# Altium footprint library JEDEC_G.PcbLib: 194 footprints (part 4 of 13)
Each footprint in its own frame and in the unit in brackets; x right, y up, seen from the top. Pads: shape width x height; smd on the part's side, far side on the other; paste and mask are expansions set on the pad; w line width, h text height; cw(c..) or ccw(c..) is an arc to the next point about the centre after c.
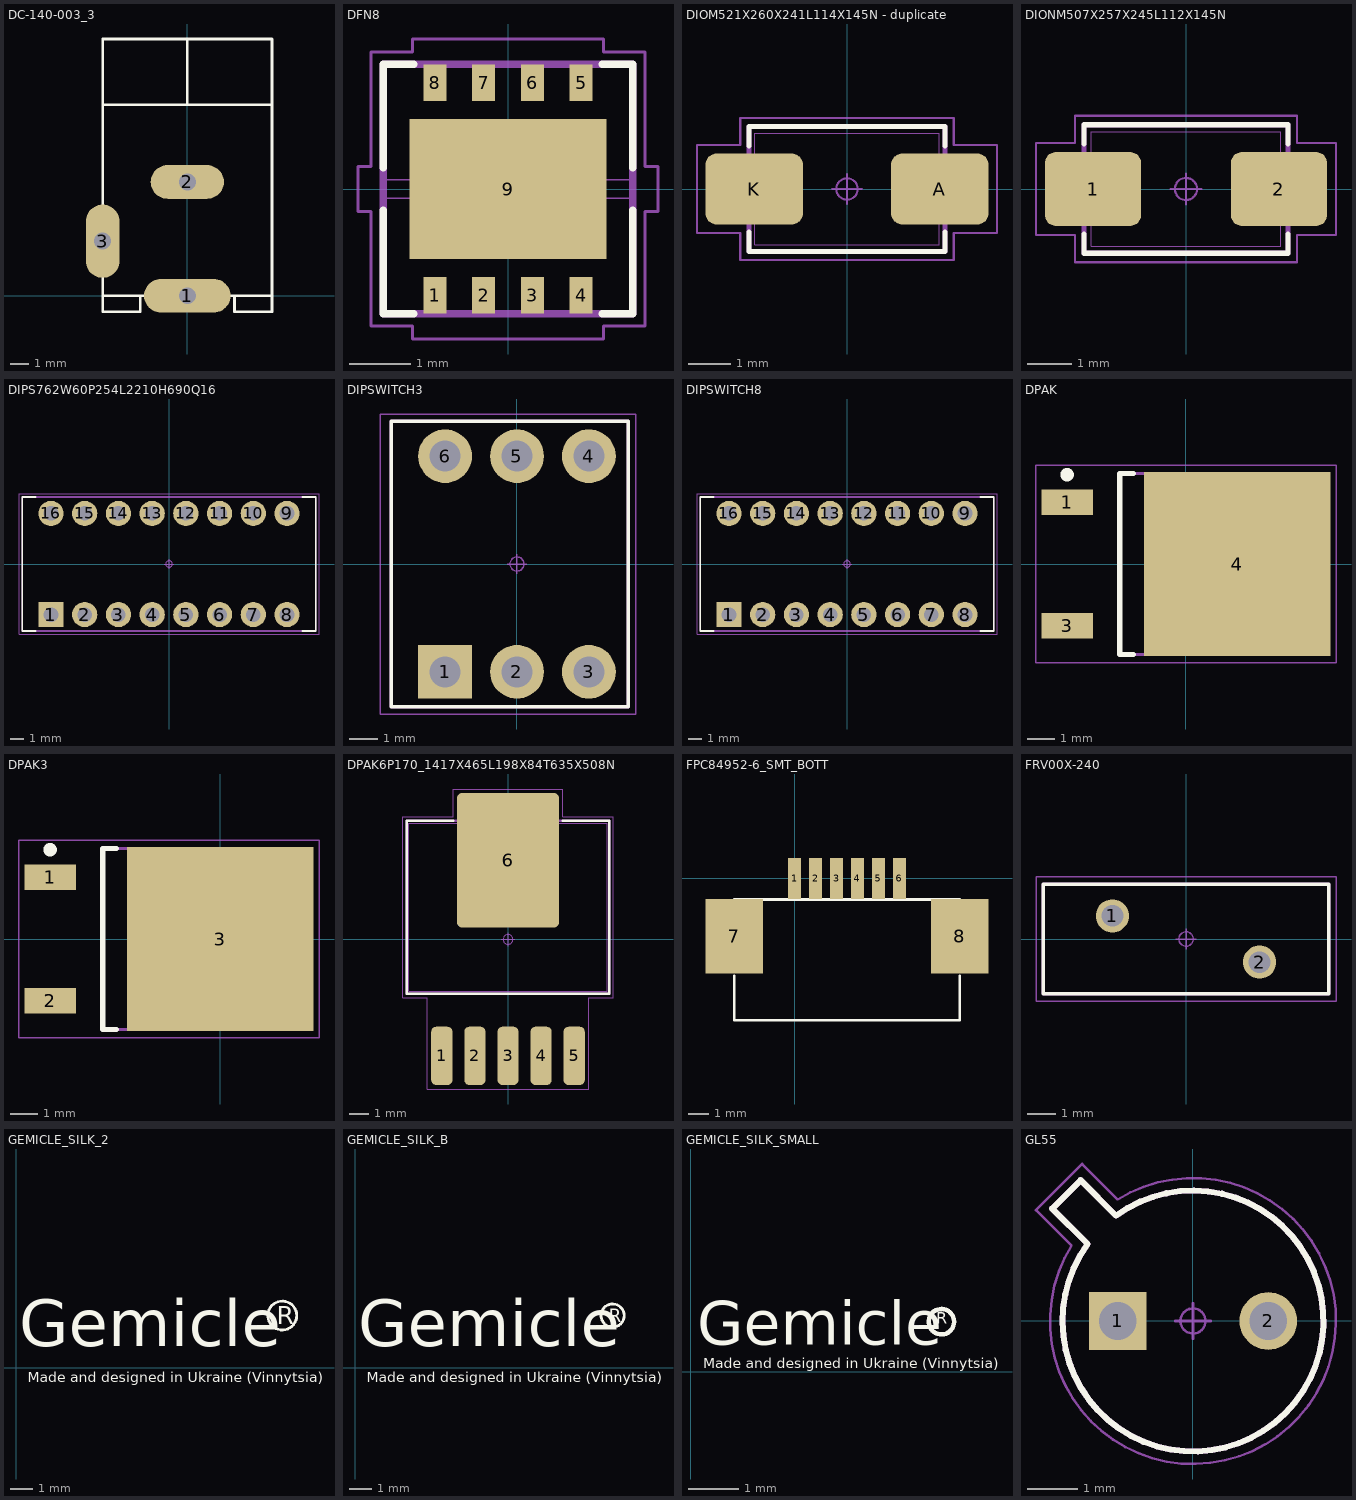
[diagram p3: the footprints below, top view; thin cyan lines are the x and y axes]

## DC-140-003_3 [mm]
pads (3):
  oval 4.6x1.8 hole 0.9: 1(0,0)
  oval 3.9x1.8 hole 0.9: 2(0,6.05)
  oval 1.8x3.9 hole 0.9: 3(-4.5,2.9)
Top Overlay:
  lines w0.15: -4.5,10.15 4.475,10.15 ; -2.5,0 -2.5,-0.85 -4.5,-0.85 -4.5,0 ; 0,10.15 0,13.65 ; 2.5,0 2.5,-0.85 4.5,-0.85 4.5,0 ; -4.5,0 4.5,0 ; -4.5,0 -4.5,13.65 4.5,13.65 4.5,0
Mechanical 16:
  lines w0.05: -4.95,1.85 ccw(c-4.5,1.85) -4.05,1.85 -4.05,3.95 ccw(c-4.5,3.95) -4.95,3.95 -4.95,1.85 ; -1.3,-0.45 cw(c-1.3,0) -1.3,0.45 1.3,0.45 cw(c1.3,0) 1.3,-0.45 -1.3,-0.45 ; -1.05,5.6 cw(c-1.05,6.05) -1.05,6.5 1.05,6.5 cw(c1.05,6.05) 1.05,5.6 -1.05,5.6
3D body "CUI_PJ-102A.STEP": height 11, standoff -3.5, extent -5,-0.8 4.4,13.6

## DFN8 [mm] "Quad Flat No-Lead (QFN), 0.80 mm pitch; square, 4 pin X 1 pin, 4.00 mm L X 4.00 mm W X 1.00 mm H body"
height 1
pads (9):
  rect 0.38x0.6 smd: 1(-1.2,-1.75) 2(-0.4,-1.75) 3(0.4,-1.75) 4(1.2,-1.75) 5(1.2,1.75) 6(0.4,1.75) 7(-0.4,1.75) 8(-1.2,1.75)
  rect 3.24x2.3 smd: 9(0,0)
Top Overlay:
  lines w0.12: -2.05,-0.35 -2.05,-2.05 -1.55,-2.05 ; -2.05,0.35 -2.05,2.05 -1.55,2.05 ; 1.55,-2.05 2.05,-2.05 2.05,-0.35 ; 1.55,2.05 2.05,2.05 2.05,0.35
Mechanical 11:
  lines w0.12: -2.05,-2.05 2.05,-2.05 2.05,2.05 -2.05,2.05 -2.05,-2.05
Mechanical 12:
  lines w0.025: -2,-2 2,-2 2,2 -2,2 -2,-2 ; -2,-0.152 -2,0.152 -1.5,0.152 -1.5,-0.152 -2,-0.152 ; -1.352,-2 -1.352,-1.5 -1.048,-1.5 -1.048,-2 -1.352,-2 ; -1.352,1.5 -1.352,2 -1.048,2 -1.048,1.5 -1.352,1.5 ; -0.553,-2 -0.553,-1.5 -0.248,-1.5 -0.248,-2 -0.553,-2 ; -0.553,1.5 -0.553,2 -0.248,2 -0.248,1.5 -0.553,1.5 ; 0.248,-2 0.248,-1.5 0.553,-1.5 0.553,-2 0.248,-2 ; 0.248,1.5 0.248,2 0.553,2 0.553,1.5 0.248,1.5 ; 1.048,-2 1.048,-1.5 1.352,-1.5 1.352,-2 1.048,-2 ; 1.048,1.5 1.048,2 1.352,2 1.352,1.5 1.048,1.5 ; 1.5,-0.152 2,-0.152 2,0.152 1.5,0.152 1.5,-0.152
Mechanical 15:
  circle w0.05: c0,0 r0.25
  lines w0.05: -0.35,0 0.35,0 ; 0,-0.35 0,0.35 ; -2.465,-0.37 -2.25,-0.37 -2.25,-2.25 -1.57,-2.25 -1.57,-2.465 1.57,-2.465 1.57,-2.25 2.25,-2.25 2.25,-0.37 2.465,-0.37 2.465,0.37 2.25,0.37 2.25,2.25 1.57,2.25 1.57,2.465 -1.57,2.465 -1.57,2.25 -2.25,2.25 -2.25,0.37 -2.465,0.37 -2.465,-0.37
Mechanical 16:
  text ".Designator" at 0,0 h1.2
3D body "DFN8.STEP": height 1, standoff 0, extent -2.05,-2.05 2.05,2.05

## DIOM521X260X241L114X145N - duplicate [mm] "Diode, Molded Body; 4.315 mm L X 2.605 mm W X 2.41 mm H body"
height 2.41
pads (2):
  rrect30% 2.27x1.65 smd: A(2.165,0) K(-2.165,0)
Top Overlay:
  lines w0.12: -2.29,-1.005 -2.29,-1.46 2.29,-1.46 2.29,-1.005 ; -2.29,1.005 -2.29,1.46 2.29,1.46 2.29,1.005
Mechanical 11:
  lines w0.12: -2.29,-1.46 -2.29,1.46 2.29,1.46 2.29,-1.46 -2.29,-1.46
Mechanical 12:
  lines w0.025: -2.605,-0.725 -1.465,-0.725 -1.465,0.725 -2.605,0.725 -2.605,-0.725 ; -2.157,-1.302 -2.157,1.302 2.157,1.302 2.157,-1.302 -2.157,-1.302 ; 1.465,-0.725 1.465,0.725 2.605,0.725 2.605,-0.725 1.465,-0.725
Mechanical 15:
  circle w0.05: c0,0 r0.25
  lines w0.05: -0.35,0 0.35,0 ; 0,-0.35 0,0.35 ; -3.5,-1.025 -3.5,1.025 -2.49,1.025 -2.49,1.66 2.49,1.66 2.49,1.025 3.5,1.025 3.5,-1.025 2.49,-1.025 2.49,-1.66 -2.49,-1.66 -2.49,-1.025 -3.5,-1.025
3D body "DIOM521X260X241L114X145.STEP": height 2.41, standoff 0, extent -2.605,-1.302 2.605,1.302

## DIONM507X257X245L112X145N [mm] "Diode, Non-Polarized, Molded Body; 4.275 mm L X 2.575 mm W X 2.45 mm H body"
height 2.45
pads (2):
  rrect30% 2.17x1.67 smd: 1(-2.095,0) 2(2.095,0)
Top Overlay:
  lines w0.12: -2.3,-1.015 -2.3,-1.45 2.3,-1.45 2.3,-1.015 ; -2.3,1.015 -2.3,1.45 2.3,1.45 2.3,1.015
Mechanical 11:
  lines w0.12: -2.3,-1.45 2.3,-1.45 2.3,1.45 -2.3,1.45 -2.3,-1.45
Mechanical 12:
  lines w0.025: -2.538,-0.725 -2.538,0.725 -1.412,0.725 -1.412,-0.725 -2.538,-0.725 ; -2.137,-1.288 2.137,-1.288 2.137,1.288 -2.137,1.288 -2.137,-1.288 ; 1.412,-0.725 2.538,-0.725 2.538,0.725 1.412,0.725 1.412,-0.725
Mechanical 15:
  circle w0.05: c0,0 r0.25
  lines w0.05: -0.35,0 0.35,0 ; 0,-0.35 0,0.35 ; -3.38,-1.035 -2.5,-1.035 -2.5,-1.65 2.5,-1.65 2.5,-1.035 3.38,-1.035 3.38,1.035 2.5,1.035 2.5,1.65 -2.5,1.65 -2.5,1.035 -3.38,1.035 -3.38,-1.035
3D body "DIONM507X257X245L112X145.STEP": height 2.45, standoff 0, extent -2.538,-1.288 2.538,1.288

## DIPS762W60P254L2210H690Q16 [mm] "DIPS, 7.62 mm lead span, 2.54 mm pitch; 16 pin, 22.10 mm L X 10.10 mm W X 6.90 mm H body"
height 6.9
pads (16):
  rect 1.9x1.9 / inner round 1.71 / far side rect 1.71x1.71 hole 1.1 paste-1.71: 1(-8.89,-3.81)
  round 1.9 / inner round 1.71 / far side round 1.71 hole 1.1 paste-1.71: 2(-6.35,-3.81) 3(-3.81,-3.81) 4(-1.27,-3.81) 5(1.27,-3.81) 6(3.81,-3.81) 7(6.35,-3.81) 8(8.89,-3.81) 9(8.89,3.81) 10(6.35,3.81) 11(3.81,3.81) 12(1.27,3.81) 13(-1.27,3.81) 14(-3.81,3.81) 15(-6.35,3.81) 16(-8.89,3.81)
Top Overlay:
  lines w0.12: -10.03,-5.05 -11.05,-5.05 -11.05,5.05 -10.03,5.05 ; 10.03,-5.05 11.05,-5.05 11.05,5.05 10.03,5.05
Mechanical 11:
  lines w0.12: -11.05,-5.05 11.05,-5.05 11.05,5.05 -11.05,5.05 -11.05,-5.05
Mechanical 12:
  lines w0.025: -11.05,-5.05 11.05,-5.05 11.05,5.05 -11.05,5.05 -11.05,-5.05 ; -9.24,-4.16 -9.24,-3.46 -8.54,-3.46 -8.54,-4.16 -9.24,-4.16 ; -9.24,3.46 -9.24,4.16 -8.54,4.16 -8.54,3.46 -9.24,3.46 ; -6.7,-4.16 -6.7,-3.46 -6,-3.46 -6,-4.16 -6.7,-4.16 ; -6.7,3.46 -6.7,4.16 -6,4.16 -6,3.46 -6.7,3.46 ; -4.16,-4.16 -4.16,-3.46 -3.46,-3.46 -3.46,-4.16 -4.16,-4.16 ; -4.16,3.46 -4.16,4.16 -3.46,4.16 -3.46,3.46 -4.16,3.46 ; -1.62,-4.16 -1.62,-3.46 -0.92,-3.46 -0.92,-4.16 -1.62,-4.16 ; -1.62,3.46 -1.62,4.16 -0.92,4.16 -0.92,3.46 -1.62,3.46 ; 0.92,-4.16 0.92,-3.46 1.62,-3.46 1.62,-4.16 0.92,-4.16 ; 0.92,3.46 0.92,4.16 1.62,4.16 1.62,3.46 0.92,3.46 ; 3.46,-4.16 3.46,-3.46 4.16,-3.46 4.16,-4.16 3.46,-4.16 ; 3.46,3.46 3.46,4.16 4.16,4.16 4.16,3.46 3.46,3.46 ; 6,-4.16 6,-3.46 6.7,-3.46 6.7,-4.16 6,-4.16 ; 6,3.46 6,4.16 6.7,4.16 6.7,3.46 6,3.46 ; 8.54,-4.16 8.54,-3.46 9.24,-3.46 9.24,-4.16 8.54,-4.16 ; 8.54,3.46 8.54,4.16 9.24,4.16 9.24,3.46 8.54,3.46
Mechanical 15:
  circle w0.05: c0,0 r0.25
  lines w0.05: -0.35,0 0.35,0 ; 0,-0.35 0,0.35 ; -11.3,-5.3 11.3,-5.3 11.3,5.3 -11.3,5.3 -11.3,-5.3
Mechanical 16:
  text ".Designator" at 0,0 h1.2
3D body "DIPS762W60P254L2210H690Q16.STEP": height 6.9, standoff -2, extent -11.05,-5.05 11.05,5.05

## DIPSWITCH3 [mm]
height 6.9
pads (6):
  rect 1.9x1.9 / inner round 1.71 / far side round 1.71 hole 1.1 paste-1.71: 1(-2.54,-3.81)
  round 1.9 / inner round 1.71 / far side round 1.71 hole 1.1 paste-1.71: 2(0,-3.81) 3(2.54,-3.81) 4(2.54,3.81) 5(0,3.81) 6(-2.54,3.81)
Top Overlay:
  lines w0.12: -4.445,-5.05 -4.445,5.05 3.937,5.05 3.937,-5.05 -4.445,-5.05
Mechanical 11:
  lines w0.12: -4.445,-5.05 3.937,-5.05 3.937,5.05 -4.445,5.05 -4.445,-5.05
Mechanical 15:
  circle w0.05: c0,0 r0.25
  lines w0.05: -0.35,0 0.35,0 ; 0,-0.35 0,0.35 ; -4.826,-5.3 4.191,-5.3 4.191,5.3 -4.826,5.3 -4.826,-5.3
Mechanical 16:
  text ".Designator" at 0,0 h1.2
3D body "DIP Switch x03 Red.stp": height 6.85, standoff -3.4, extent -4.31,-4.95 4.31,4.95

## DIPSWITCH8 [mm] "DIPS, 7.62 mm lead span, 2.54 mm pitch; 16 pin, 22.10 mm L X 10.10 mm W X 6.90 mm H body"
height 6.9
pads (16):
  rect 1.9x1.9 / inner round 1.71 / far side rect 1.71x1.71 hole 1.1 paste-1.71: 1(-8.89,-3.81)
  round 1.9 / inner round 1.71 / far side round 1.71 hole 1.1 paste-1.71: 2(-6.35,-3.81) 3(-3.81,-3.81) 4(-1.27,-3.81) 5(1.27,-3.81) 6(3.81,-3.81) 7(6.35,-3.81) 8(8.89,-3.81) 9(8.89,3.81) 10(6.35,3.81) 11(3.81,3.81) 12(1.27,3.81) 13(-1.27,3.81) 14(-3.81,3.81) 15(-6.35,3.81) 16(-8.89,3.81)
Top Overlay:
  lines w0.12: -10.03,-5.05 -11.05,-5.05 -11.05,5.05 -10.03,5.05 ; 10.03,-5.05 11.05,-5.05 11.05,5.05 10.03,5.05
Mechanical 11:
  lines w0.12: -11.05,-5.05 -11.05,5.05 11.05,5.05 11.05,-5.05 -11.05,-5.05
Mechanical 12:
  lines w0.025: -11.05,-5.05 -11.05,5.05 11.05,5.05 11.05,-5.05 -11.05,-5.05 ; -9.24,-4.16 -8.54,-4.16 -8.54,-3.46 -9.24,-3.46 -9.24,-4.16 ; -9.24,3.46 -8.54,3.46 -8.54,4.16 -9.24,4.16 -9.24,3.46 ; -6.7,-4.16 -6,-4.16 -6,-3.46 -6.7,-3.46 -6.7,-4.16 ; -6.7,3.46 -6,3.46 -6,4.16 -6.7,4.16 -6.7,3.46 ; -4.16,-4.16 -3.46,-4.16 -3.46,-3.46 -4.16,-3.46 -4.16,-4.16 ; -4.16,3.46 -3.46,3.46 -3.46,4.16 -4.16,4.16 -4.16,3.46 ; -1.62,-4.16 -0.92,-4.16 -0.92,-3.46 -1.62,-3.46 -1.62,-4.16 ; -1.62,3.46 -0.92,3.46 -0.92,4.16 -1.62,4.16 -1.62,3.46 ; 0.92,-4.16 1.62,-4.16 1.62,-3.46 0.92,-3.46 0.92,-4.16 ; 0.92,3.46 1.62,3.46 1.62,4.16 0.92,4.16 0.92,3.46 ; 3.46,-4.16 4.16,-4.16 4.16,-3.46 3.46,-3.46 3.46,-4.16 ; 3.46,3.46 4.16,3.46 4.16,4.16 3.46,4.16 3.46,3.46 ; 6,-4.16 6.7,-4.16 6.7,-3.46 6,-3.46 6,-4.16 ; 6,3.46 6.7,3.46 6.7,4.16 6,4.16 6,3.46 ; 8.54,-4.16 9.24,-4.16 9.24,-3.46 8.54,-3.46 8.54,-4.16 ; 8.54,3.46 9.24,3.46 9.24,4.16 8.54,4.16 8.54,3.46
Mechanical 15:
  circle w0.05: c0,0 r0.25
  lines w0.05: -0.35,0 0.35,0 ; 0,-0.35 0,0.35 ; -11.3,-5.3 -11.3,5.3 11.3,5.3 11.3,-5.3 -11.3,-5.3
Mechanical 16:
  text ".Designator" at 0,0 h1.2
3D body "Grayhill_78B08T.stp": height 8.02, standoff -3.43, extent -11.2,-4.95 11.2,4.95

## DPAK [mm] "D-PAK, 3-Pads, Body 6,20x6,72mm (max), IPC Medium Density"
height 2.38
pads (3):
  rect 1.9x0.95 smd: 1(-4.4,2.28) 3(-4.4,-2.28)
  rect 6.9x6.8 smd: 4(1.9,0)
Top Overlay:
  circle w0.25: c-4.4,3.305 r0.125
  lines w0.2: -1.95,-3.35 -2.45,-3.35 -2.45,3.35 -1.95,3.35
Mechanical 13:
  lines w0.1: -2.45,-3.35 -2.45,3.35 3.75,3.35 3.75,-3.35 -2.45,-3.35
Mechanical 15:
  lines w0.05: -5.55,-3.65 -5.55,3.65 5.55,3.65 5.55,-3.65 -5.55,-3.65
  lines w0.1: -0.5,0 0.5,0 ; 0,-0.5 0,0.5
3D body: height 2.38, standoff 0, extent -2.45,-3.35 3.75,3.35

## DPAK3 [mm]
pads (3):
  rect 1.9x0.95 smd: 1(-6.305,2.28) 2(-6.305,-2.28)
  rect 6.9x6.8 smd: 3(-0.005,0)
Top Overlay:
  circle w0.25: c-6.305,3.305 r0.125
  lines w0.2: -3.855,-3.35 -4.355,-3.35 -4.355,3.35 -3.855,3.35
Mechanical 13:
  lines w0.1: -4.355,-3.35 -4.355,3.35 1.845,3.35 1.845,-3.35 -4.355,-3.35
Mechanical 15:
  lines w0.05: -7.455,-3.65 -7.455,3.65 3.645,3.65 3.645,-3.65 -7.455,-3.65
  lines w0.1: -2.405,0 -1.405,0 ; -1.905,-0.5 -1.905,0.5
3D body "TO-252-2.step": height 2.32, standoff 0, extent -6.95,-3.25 2.95,3.25

## DPAK6P170_1417X465L198X84T635X508N [mm] "DPAK, 1.70 mm pitch; 5 pin, 8.64 mm L X 10.225 mm W X 4.65 mm H body"
height 4.65
pads (6):
  rrect46% 1.09x3 smd: 1(-3.4,-5.99) 2(-1.7,-5.99) 3(0,-5.99) 4(1.7,-5.99) 5(3.4,-5.99)
  rrect10% 5.25x6.92 smd paste-6.92: 6(0,4.07)
Top Overlay:
  lines w0.12: -2.805,6.105 -5.21,6.105 -5.21,-2.795 5.21,-2.795 5.21,6.105 2.805,6.105
Top Paste:
  region: -0.435,6.02 -2.185,6.02 -2.185,7.31 -0.435,7.31
  region: -0.435,4.29 -2.185,4.29 -2.185,5.58 -0.435,5.58
  region: -0.435,2.56 -2.185,2.56 -2.185,3.85 -0.435,3.85
  region: -0.435,0.83 -2.185,0.83 -2.185,2.12 -0.435,2.12
  region: 2.185,6.02 0.435,6.02 0.435,7.31 2.185,7.31
  region: 2.185,4.29 0.435,4.29 0.435,5.58 2.185,5.58
  region: 2.185,2.56 0.435,2.56 0.435,3.85 2.185,3.85
  region: 2.185,0.83 0.435,0.83 0.435,2.12 2.185,2.12
Mechanical 11:
  lines w0.12: -5.21,-2.795 -5.21,6.105 5.21,6.105 5.21,-2.795 -5.21,-2.795
Mechanical 12:
  lines w0.025: -5.112,-2.665 5.112,-2.665 5.112,5.975 -5.112,5.975 -5.112,-2.665 ; -3.82,-7.087 -3.82,-5.108 -2.98,-5.108 -2.98,-7.087 -3.82,-7.087 ; -2.54,0.737 -2.54,7.087 2.54,7.087 2.54,0.737 -2.54,0.737 ; -2.12,-7.087 -2.12,-5.108 -1.28,-5.108 -1.28,-7.087 -2.12,-7.087 ; -0.42,-7.087 -0.42,-5.108 0.42,-5.108 0.42,-7.087 -0.42,-7.087 ; 1.28,-7.087 1.28,-5.108 2.12,-5.108 2.12,-7.087 1.28,-7.087 ; 2.98,-7.087 2.98,-5.108 3.82,-5.108 3.82,-7.087 2.98,-7.087
Mechanical 15:
  circle w0.05: c0,0 r0.25
  lines w0.05: -0.35,0 0.35,0 ; 0,-0.35 0,0.35 ; -5.41,-2.99 -4.145,-2.99 -4.145,-7.69 4.145,-7.69 4.145,-2.99 5.41,-2.99 5.41,6.3 2.825,6.3 2.825,7.73 -2.825,7.73 -2.825,6.3 -5.41,6.3 -5.41,-2.99
Mechanical 16:
  text ".Designator" at 0,0 h1.2
3D body "DPAK6P170_1417X465L198X84T635X508.STEP": height 4.65, standoff 0, extent -5.112,-7.087 5.112,7.087

## FPC84952-6_SMT_BOTT [mm]
pads (8):
  rect 0.61x2 smd: 1(0,0) 2(1.016,0) 3(2.032,0) 4(3.048,0) 5(4.064,0) 6(5.08,0)
  rect 2.8x3.6 smd: 7(-2.921,-2.794) 8(8.001,-2.794)
Top Overlay:
  lines w0.127: -2.921,-4.699 -2.921,-6.858 8.001,-6.858 8.001,-4.699 ; -2.921,-1.016 8.001,-1.016
3D body "13m5785_84952-6.stp": height 2.51, standoff -0.05, extent -4.425,-6.43 9.505,0.11

## FRV00X-240 [mm] "Fuse, Radial (Disk with Offset Leads); 5.10 mm C X 0.50 mm W 9.90 mm L X 3.80 mm T X 12.50 mm H body"
height 12.5
pads (2):
  round 1.15 hole 0.75 paste-1.15: 1(-2.55,0.8) 2(2.55,-0.8)
Top Overlay:
  lines w0.12: -4.95,-1.9 -4.95,1.9 4.95,1.9 4.95,-1.9 -4.95,-1.9
Mechanical 11:
  lines w0.12: -4.95,-1.9 -4.95,1.9 4.95,1.9 4.95,-1.9 -4.95,-1.9
Mechanical 12:
  circle w0.025: c-2.55,0.8 r0.275
  circle w0.025: c2.55,-0.8 r0.275
  lines w0.025: -4.95,-1.9 -4.95,1.9 4.95,1.9 4.95,-1.9 -4.95,-1.9
Mechanical 15:
  circle w0.05: c0,0 r0.25
  lines w0.05: -0.35,0 0.35,0 ; 0,-0.35 0,0.35 ; -5.2,-2.15 5.2,-2.15 5.2,2.15 -5.2,2.15 -5.2,-2.15
Mechanical 16:
  text ".Designator" at 0,0 h1.2
3D body "FRV00X-240.STEP": height 12.5, standoff -2, extent -4.95,-1.9 4.95,1.9

## GEMICLE_SILK_2 [mm]
Top Overlay:
  circle w0.12: c11.684,2.286 r0.635
  text "Gemicle" at 0.127,0.254 h3.5
  text "Made and designed in Ukraine (Vinnytsia)" at 0.508,-0.635 h0.45
  text "R" at 11.43,1.905 h0.8

## GEMICLE_SILK_B [mm]
Top Overlay:
  circle w0.12: c11.303,2.286 r0.508
  text "Gemicle" at 0.127,0.254 h3.5
  text "Made and designed in Ukraine (Vinnytsia)" at 0.508,-0.635 h0.45
  text "R" at 11.125,2 h0.6

## GEMICLE_SILK_SMALL [mm]
Top Overlay:
  circle w0.09: c5,1 r0.254
  text "Gemicle" at 0.127,0.254 h1.5
  text "Made and designed in Ukraine (Vinnytsia)" at 0.254,0 h0.35
  text "R" at 4.9,0.875 h0.4

## GL55 [mm] "TO Cylindrical Style, 1.50 mm pitch; 2 pin, 5.20 mm W X 2.30 mm H body"
height 2.3
pads (2):
  rect 1.15x1.15 / inner round 1.15 / far side rect 1.15x1.15 hole 0.75 paste-1.15: 1(-1.5,0)
  round 1.15 hole 0.75 paste-1.15: 2(1.5,0)
Top Overlay:
  lines w0.12: -2.807,2.241 -2.241,2.807 -1.534,2.099 cw(c0,0) -2.099,1.534 -2.807,2.241
Mechanical 11:
  lines w0.12: -2.807,2.241 -2.241,2.807 -1.534,2.099 cw(c0,0) -2.099,1.534 -2.807,2.241
Mechanical 12:
  circle w0.025: c-1.5,0 r0.275
  circle w0.025: c1.5,0 r0.275
  lines w0.025: -2.807,2.241 -2.241,2.807 -1.534,2.099 cw(c0,0) -2.099,1.534 -2.807,2.241
Mechanical 15:
  circle w0.05: c0,0 r0.25
  lines w0.05: -0.35,0 0.35,0 ; 0,-0.35 0,0.35 ; -3.129,2.21 -2.21,3.129 -1.503,2.422 cw(c0,0) -2.422,1.503 -3.129,2.21
Mechanical 16:
  text ".Designator" at 0,0 h1.2
3D body "TO150P520H230-2.STEP": height 2.3, standoff -2, extent -2.816,-2.6 2.6,2.816